# Altium footprint library AD_Connectors.PcbLib: 131 footprints (part 5 of 9)
Each footprint in its own frame and in the unit in brackets; x right, y up, seen from the top. Pads: shape width x height; smd on the part's side, far side on the other; paste and mask are expansions set on the pad; w line width, h text height; cw(c..) or ccw(c..) is an arc to the next point about the centre after c.
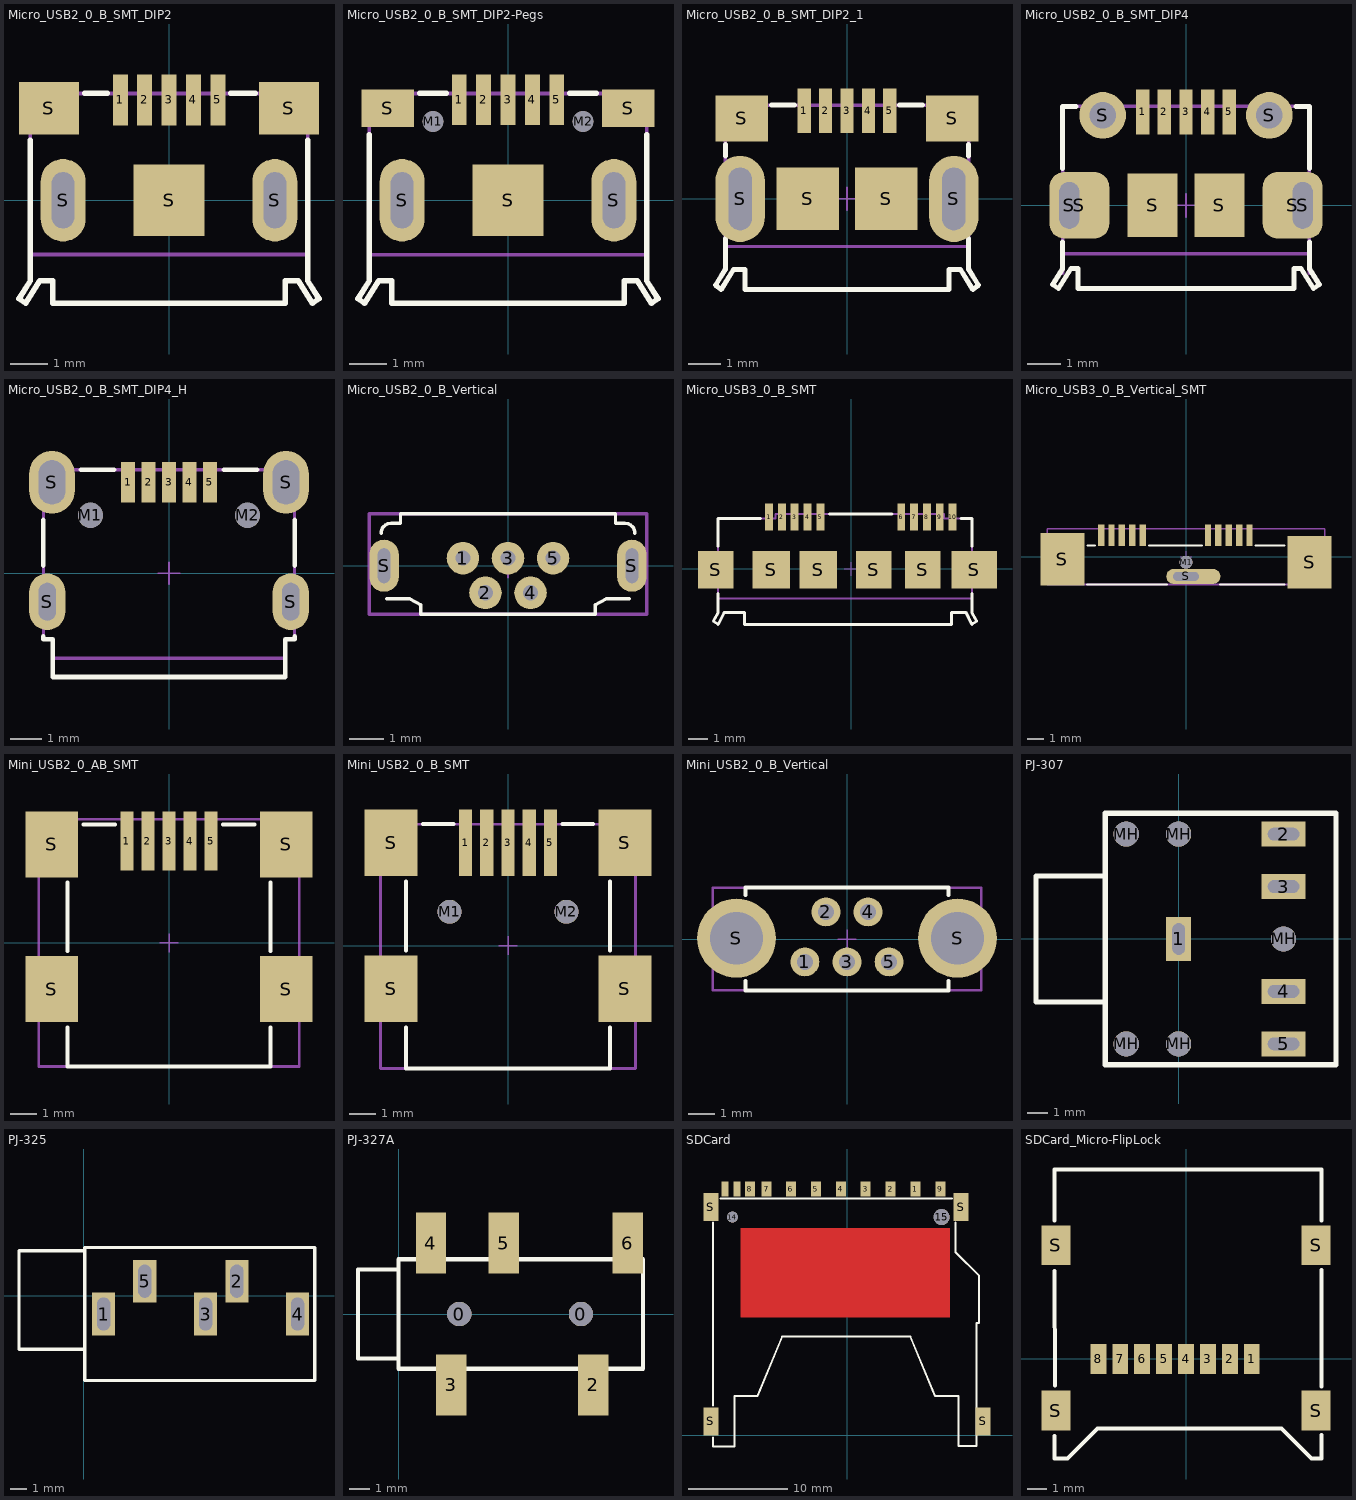
[diagram p4: the footprints below, top view; thin cyan lines are the x and y axes]

## Micro_USB2_0_B_SMT_DIP2 [mm] "Micro USB 2.0 Type B Horizontal SMT 2DIP with Pegs"
height 3
pads (10):
  rect 0.4x1.35 smd: 1(-1.3,2.675) 2(-0.65,2.675) 3(0,2.675) 4(0.65,2.675) 5(1.3,2.675)
  rect 1.6x1.4 smd: S(-3.2,2.45) S(3.2,2.45)
  rrect100% 1.2x2.2 hole 1.5 slot 0.6 at 0 deg: S(-2.825,0) S(2.825,0)
  rect 1.9x1.9 smd: S(0,0)
Top Overlay:
  lines w0.15: -3.7,1.6 -3.7,-2.15 -4,-2.625 -3.825,-2.75 -3.45,-2.15 -3.1,-2.15 -3.1,-2.75 3.1,-2.75 3.1,-2.15 3.45,-2.15 3.825,-2.75 4,-2.625 3.7,-2.15 3.7,1.6 ; -2.25,2.85 -1.65,2.85 ; 1.65,2.85 2.3,2.85
Mechanical 1:
  lines w0.1: -3.7,-1.45 3.7,-1.45
  text "PCB Edge" at -1.4,-2.1 h0.76
Mechanical 13:
  lines w0.1: -4,-2.625 -3.825,-2.75 -3.45,-2.15 -3.1,-2.15 -3.1,-2.75 3.1,-2.75 3.1,-2.15 3.45,-2.15 3.825,-2.75 4,-2.625 3.7,-2.15 3.7,2.85 -3.7,2.85 -3.7,-2.15 -4,-2.625
Mechanical 15:
  lines w0.05: -0.35,0 0.35,0 ; 0,-0.35 0,0.35
3D body "User Library-usb_port_ch.STEP": height 2.82, standoff -0.75, extent -4,-2.75 4,2.85

## Micro_USB2_0_B_SMT_DIP2-Pegs [mm] "Micro USB 2.0 Type B Horizontal SMT 2DIP with Pegs"
height 3
pads (12):
  rect 0.4x1.35 smd: 1(-1.3,2.675) 2(-0.65,2.675) 3(0,2.675) 4(0.65,2.675) 5(1.3,2.675)
  round 0.55 hole 0.55 unplated: M1(-2,2.1) M2(2,2.1)
  rect 1.4x1 smd: S(-3.2,2.45) S(3.2,2.45)
  rrect100% 1.2x2.2 hole 1.5 slot 0.6 at 0 deg: S(-2.825,0) S(2.825,0)
  rect 1.9x1.9 smd: S(0,0)
Top Overlay:
  lines w0.15: -3.7,1.75 -3.7,-2.15 -4,-2.625 -3.825,-2.75 -3.45,-2.15 -3.1,-2.15 -3.1,-2.75 3.1,-2.75 3.1,-2.15 3.45,-2.15 3.825,-2.75 4,-2.625 3.7,-2.15 3.7,1.75 ; -2.35,2.85 -1.65,2.85 ; 1.65,2.85 2.35,2.85
Mechanical 1:
  lines w0.1: -3.7,-1.45 3.7,-1.45
  text "PCB Edge" at -1.4,-2.1 h0.76
Mechanical 13:
  lines w0.1: -4,-2.625 -3.7,-2.15 -3.7,2.85 3.7,2.85 3.7,-2.15 4,-2.625 3.825,-2.75 3.45,-2.15 3.1,-2.15 3.1,-2.75 -3.1,-2.75 -3.1,-2.15 -3.45,-2.15 -3.825,-2.75 -4,-2.625
Mechanical 15:
  lines w0.05: -0.35,0 0.35,0 ; 0,-0.35 0,0.35
3D body "User Library-usb_port_ch.STEP": height 2.82, standoff -0.75, extent -4,-2.75 4,2.85

## Micro_USB2_0_B_SMT_DIP2_1 [mm] "Micro USB 2.0 Type B Horizontal SMT 2DIP"
height 3
pads (11):
  rect 0.4x1.35 smd: 1(-1.3,2.675) 2(-0.65,2.675) 3(0,2.675) 4(0.65,2.675) 5(1.3,2.675)
  rrect100% 1.5x2.62 hole 1.9 slot 0.7 at 0 deg: S(-3.25,0) S(3.25,0)
  rect 1.6x1.4 smd: S(-3.2,2.45) S(3.2,2.45)
  rect 1.9x1.9 smd: S(-1.2,0) S(1.2,0)
Top Overlay:
  lines w0.15: -3.7,-1.2 -3.7,-2.15 -4,-2.625 -3.825,-2.75 -3.45,-2.15 -3.1,-2.15 -3.1,-2.75 3.1,-2.75 3.1,-2.15 3.45,-2.15 3.825,-2.75 4,-2.625 3.7,-2.15 3.7,-1.2 ; -3.7,1.3 -3.7,1.65 ; -2.3,2.85 -1.6,2.85 ; 1.6,2.85 2.3,2.85 ; 3.7,1.3 3.7,1.65
Mechanical 1:
  lines w0.1: -3.7,-1.45 3.7,-1.45
  text "PCB Edge" at -1.4,-2.1 h0.76
Mechanical 13:
  lines w0.1: -4,-2.625 -3.7,-2.15 -3.7,2.85 3.7,2.85 3.7,-2.15 4,-2.625 3.825,-2.75 3.45,-2.15 3.1,-2.15 3.1,-2.75 -3.1,-2.75 -3.1,-2.15 -3.45,-2.15 -3.825,-2.75 -4,-2.625
Mechanical 15:
  lines w0.05: -0.35,0 0.35,0 ; 0,-0.35 0,0.35
3D body "msbr-18.stp": height 2.85, standoff -0.7, extent -4.049,-2.702 4.049,2.929

## Micro_USB2_0_B_SMT_DIP4 [mm] "Micro USB 2.0 Type B Horizontal SMT 4DIP"
height 3
pads (13):
  rect 0.4x1.35 smd: 1(-1.3,2.805) 2(-0.65,2.805) 3(0,2.805) 4(0.65,2.805) 5(1.3,2.805)
  rrect100% 1.2x2 hole 1.4 slot 0.6 at 0 deg: S(-3.5,0) S(3.5,0)
  rrect50% 1.8x2 smd: S(-3.2,0) S(3.2,0)
  round 1.4 hole 0.8: S(-2.5,2.7) S(2.5,2.7)
  rect 1.5x1.9 smd: S(-1,0) S(1,0)
Top Overlay:
  lines w0.15: -3.7,-1.1 -3.7,-1.9 -4,-2.375 -3.825,-2.5 -3.45,-1.9 -3.24,-1.9 -3.24,-2.5 3.24,-2.5 3.24,-1.9 3.45,-1.9 3.825,-2.5 4,-2.375 3.7,-1.9 3.7,-1.1 ; -3.7,1.1 -3.7,2.97 -3.3,2.97 ; 3.3,2.97 3.7,2.97 3.7,1.1
Mechanical 1:
  lines w0.1: -3.7,-1.45 3.7,-1.45
  text "PCB Edge" at -1.5,-2.1 h0.76
Mechanical 13:
  lines w0.1: -3.7,-2.04 -3.7,2.97 3.7,2.97 3.7,-2.04 ; -3.7,-1.9 -4,-2.375 -3.825,-2.5 -3.45,-1.9 -3.24,-1.9 -3.24,-2.5 3.24,-2.5 3.24,-1.9 3.45,-1.9 3.825,-2.5 4,-2.375 3.7,-1.9
Mechanical 15:
  lines w0.05: -0.35,0 0.35,0 ; 0,-0.35 0,0.35
3D body "Micro USB 2.0 Type B Horizontal SMT 4DIP.step": height 2.7, standoff -0.6, extent -4.1,-2.53 4.1,2.9

## Micro_USB2_0_B_SMT_DIP4_H [mm] "Micro USB 2.0 SMT Type B Horizontal 5 Contacts High Current"
height 2.66
pads (11):
  rect 0.45x1.3 smd: 1(-1.3,2.9) 2(-0.65,2.9) 3(0,2.9) 4(0.65,2.9) 5(1.3,2.9)
  round 0.8 hole 0.8 unplated: M1(-2.5,1.85) M2(2.5,1.85)
  oval 1.15x1.8 hole 0.55 slot 1.2 at 90 deg: S(-3.875,-0.9) S(3.875,-0.9)
  oval 1.45x2 hole 0.85 slot 1.4 at 90 deg: S(-3.725,2.9) S(3.725,2.9)
Top Overlay:
  lines w0.15: -4,-2 -4,-2.1 -3.7,-2.1 -3.7,-3.3 3.7,-3.3 3.7,-2.1 4,-2.1 4,-2 ; -4,0.25 -4,1.7 ; -2.8,3.3 -1.75,3.3 ; 1.75,3.3 2.8,3.3 ; 4,0.25 4,1.7
Mechanical 1:
  lines w0.1: -3.7,-2.7 3.7,-2.7
  text "PCB Edge" at -1.4,-2.5 h0.76
  text "PCB Thickness 1.2mm" at -3.4,-4 h0.76
Mechanical 13:
  lines w0.1: -4,-2.1 -4,3.3 4,3.3 4,-2.1 3.7,-2.1 3.7,-3.3 -3.7,-3.3 -3.7,-2.1 -4,-2.1
Mechanical 15:
  lines w0.05: -0.35,0 0.35,0 ; 0,-0.35 0,0.35
3D body "629105150521.stp": height 2.77, standoff -1.75, extent -4,-3.3 4,3.303

## Micro_USB2_0_B_Vertical [mm] "Micro USB 2.0 Type B Vertical 5 Contacts"
height 5.61
pads (7):
  round 0.94 hole 0.44: 1(-1.3,0.22) 2(-0.65,-0.78) 3(0,0.22) 4(0.65,-0.78) 5(1.3,0.22)
  oval 0.85x1.5 hole 0.35 slot 1 at 90 deg: S(-3.575,0) S(3.575,0)
Top Overlay:
  lines w0.1: -3.66,0.94 cw(c-3.38,0.94) -3.373,1.22 -3.1,1.22 -3.1,1.5 3.1,1.5 3.1,1.22 3.373,1.22 cw(c3.38,0.94) 3.66,0.94 ; -3.5,-0.953 -2.828,-0.953 -2.51,-1.13 -2.51,-1.4 2.51,-1.4 2.51,-1.13 2.828,-0.953 3.5,-0.953
Mechanical 1:
  text "PCB Thickness 1.0mm" at -3.5,-2.1 h0.76
Mechanical 13:
  lines w0.1: -4,-1.4 -4,1.5 4,1.5 4,-1.4 -4,-1.4
Mechanical 15:
  lines w0.05: -0.35,0 0.35,0 ; 0,-0.35 0,0.35
3D body "614105150721.stp": height 5.61, standoff -1.84, extent -4,-1.4 4,1.5

## Micro_USB3_0_B_SMT [mm] "Micro USB 3.0 Type B Horizontal SMT"
height 2.58
pads (16):
  rect 0.4x1.35 smd: 1(-4.17,2.63) 2(-3.52,2.63) 3(-2.87,2.63) 4(-2.22,2.63) 5(-1.57,2.63) 6(2.53,2.63) 7(3.18,2.63) 8(3.83,2.63) 9(4.48,2.63) 10(5.13,2.63)
  rect 1.8x1.9 smd: S(-6.87,-0.045) S(1.13,-0.045) S(3.63,-0.045)
  rect 1.9x1.9 smd: S(-4.07,-0.045) S(-1.67,-0.045)
  rect 2.3x1.9 smd: S(6.23,-0.045)
Top Overlay:
  lines w0.15: -6.745,-1.25 -6.745,-2.205 -6.995,-2.645 -6.745,-2.805 -6.445,-2.205 -5.405,-2.205 -5.405,-2.805 5.065,-2.805 5.065,-2.205 5.805,-2.205 6.105,-2.805 6.355,-2.645 6.105,-2.205 6.105,-1.25 ; -6.745,1.15 -6.745,2.545 -4.6,2.545 ; -1.1,2.795 2.05,2.795 ; 5.55,2.545 6.105,2.545 6.105,1.15
Mechanical 1:
  lines w0.1: -6.745,-1.495 6.105,-1.495
  text "PCB Edge" at -1.82,-2.308 h0.89
Mechanical 13:
  lines w0.1: -6.995,-2.645 -6.745,-2.805 -6.445,-2.205 -5.405,-2.205 -5.405,-2.805 5.065,-2.805 5.065,-2.205 5.805,-2.205 6.105,-2.805 6.355,-2.645 6.105,-2.205 6.105,2.545 4.7,2.545 4.7,2.795 -3.85,2.795 -3.85,2.545 -6.745,2.545 -6.745,-2.205 -6.995,-2.645
Mechanical 15:
  lines w0.05: -0.35,0 0.35,0 ; 0,-0.35 0,0.35
3D body "692622030100.stp": height 2.84, standoff -0.11, extent -6.87,-2.795 6.872,2.807

## Micro_USB3_0_B_Vertical_SMT [mm] "Micro USB 3.0 Type B Vertical SMT"
height 5.15
pads (14):
  rect 0.4x1.35 smd: 1(3.98,1.34) 2(3.33,1.34) 3(2.68,1.34) 4(2.03,1.34) 5(1.38,1.34) 6(-2.72,1.34) 7(-3.37,1.34) 8(-4.02,1.34) 9(-4.67,1.34) 10(-5.32,1.34)
  round 0.8 hole 0.8 unplated: M1(0,-0.35)
  rect 2.75x3.3 smd: S(-7.75,-0.16) S(7.75,-0.35)
  oval 3.4x0.95 hole 0.55 slot 1.6 at 0 deg copper offset 0.46,0: S(0,-1.24)
Top Overlay:
  lines w0.15: -6.18,-1.75 -1.21,-1.75 ; -6.17,0.7 -5.72,0.7 ; -2.32,0.7 0.98,0.7 ; 2.13,-1.75 6.17,-1.75 ; 4.37,0.7 6.17,0.7
Mechanical 13:
  lines w0.1: -8.7,-1.75 8.7,-1.75 8.7,1.75 -8.7,1.75 -8.7,-1.75
Mechanical 15:
  lines w0.05: -0.35,0 0.35,0 ; 0,-0.35 0,0.35
3D body "692622420101.stp": height 5.82, standoff -0.83, extent -8.7,-1.75 8.7,1.75

## Mini_USB2_0_AB_SMT [mm] "Mini USB 2.0 Type AB SMT Horizontal 5 Contacts"
height 4
pads (9):
  rect 0.5x2.25 smd: 1(-1.6,3.865) 2(-0.8,3.865) 3(0,3.865) 4(0.8,3.865) 5(1.6,3.865)
  rect 2x2.5 smd: S(-4.45,-1.76) S(-4.45,3.74) S(4.45,-1.76) S(4.45,3.74)
Top Overlay:
  lines w0.15: -3.85,-3.21 -3.85,-4.7 3.85,-4.7 3.85,-3.21 ; -3.85,-0.31 -3.85,2.29 ; -3.25,4.5 -2.05,4.5 ; 2.05,4.5 3.25,4.5 ; 3.85,-0.31 3.85,2.29
Mechanical 13:
  lines w0.1: -4.95,-4.7 4.95,-4.7 4.95,4.7 -4.95,4.7 -4.95,-4.7
Mechanical 15:
  lines w0.05: -0.35,0 0.35,0 ; 0,-0.35 0,0.35
3D body "651305142821.stp": height 4.1, standoff 0, extent -4.95,-4.7 4.95,4.7

## Mini_USB2_0_B_SMT [mm] "Mini USB 2.0 Type B SMT Horizontal 5 Contacts"
height 3.9
pads (11):
  rect 0.5x2.5 smd: 1(-1.6,3.875) 2(-0.8,3.875) 3(0,3.875) 4(0.8,3.875) 5(1.6,3.875)
  round 0.9 hole 0.9 unplated: M1(-2.2,1.275) M2(2.2,1.275)
  rect 2x2.5 smd: S(-4.4,-1.625) S(-4.4,3.875) S(4.4,-1.625) S(4.4,3.875)
Top Overlay:
  lines w0.15: -3.85,-3.075 -3.85,-4.625 3.85,-4.625 3.85,-3.075 ; -3.85,-0.175 -3.85,2.425 ; -3.2,4.575 -2.05,4.575 ; 2.05,4.575 3.2,4.575 ; 3.85,-0.175 3.85,2.425
Mechanical 13:
  lines w0.1: -4.8,-4.625 4.8,-4.625 4.8,4.575 -4.8,4.575 -4.8,-4.625
Mechanical 15:
  lines w0.05: -0.35,0 0.35,0 ; 0,-0.35 0,0.35
3D body "65100516121.stp": height 3.92, standoff -0.98, extent -4.8,-4.625 4.8,4.625

## Mini_USB2_0_B_Vertical [mm] "Mini USB 2.0 Type B Vertical 5 Contacts"
height 9.2
pads (7):
  round 1.1 hole 0.6: 1(-1.6,-0.87) 2(-0.8,1.03) 3(0,-0.87) 4(0.8,1.03) 5(1.6,-0.87)
  round 3 hole 2: S(-4.2,0.03) S(4.2,0.03)
Top Overlay:
  lines w0.15: -3.85,-1.6 -3.85,-1.95 3.85,-1.95 3.85,-1.6 ; -3.85,1.67 -3.85,1.95 3.85,1.95 3.85,1.67
Mechanical 13:
  lines w0.1: -5.1,-1.95 -5.1,1.95 5.1,1.95 5.1,-1.95 -5.1,-1.95
Mechanical 15:
  lines w0.05: -0.35,0 0.35,0 ; 0,-0.35 0,0.35
3D body "651005136421.stp": height 9.45, standoff -2.55, extent -5.099,-1.92 5.098,1.98

## PJ-307 [mm]
pads (10):
  rect 1.2x2.1 hole 1.5 slot 0.6 at 0 deg: 1(0,0)
  rect 2.1x1.2 hole 1.5 slot 0.6 at 90 deg: 2(5,5) 3(5,2.5) 4(5,-2.5) 5(5,-5)
  round 1.2 hole 1.2: MH(-2.5,-5) MH(-2.5,5) MH(0,-5) MH(0,5) MH(5,0)
Top Overlay:
  lines w0.254: -3.5,-3 -6.8,-3 -6.8,3 -3.5,3 ; -3.5,-6 7.5,-6 7.5,6 -3.5,6 -3.5,-6

## PJ-325 [mm] "Connector; Stereo Jack, 3.5mm, 5 Position"
pads (5):
  rect 1.4x2.6 hole 0.8 slot 2 at 90 deg: 1(1.2,-1.1) 2(9.3,0.9) 3(7.4,-1.1) 4(13,-1.1) 5(3.7,0.9)
Top Overlay:
  lines w0.2: 0.05,-3.25 -3.95,-3.25 -3.95,2.75 0.05,2.75 ; 0.05,-5.15 0.05,2.95 14.05,2.95 14.05,-5.15 0.05,-5.15
3D body "User Library-Switchcraft-35RAPC4BV4.step": height 11.5, standoff -2.62, extent -3.985,-5.2 13.985,2.9

## PJ-327A [mm] "Connector; Stereo Jack with Mic, 3.5mm, 5 Position"
pads (7):
  round 1.2 hole 1.2: 0(3,0) 0(9,0)
  rect 1.5x3 smd: 2(9.6,-3.5) 3(2.6,-3.5) 4(1.6,3.5) 5(5.2,3.5) 6(11.3,3.5)
Top Overlay:
  lines w0.2: 0,-2.2 -2,-2.2 -2,2.2 0,2.2 ; 0,-2.7 12.05,-2.7 12.05,2.7 0,2.7 0,-2.7
Mechanical 1:
  lines w0.1: 0,-2.7 0,2.7
  text "PCB Edge" at -0.7,1.5 h0.76

## SDCard [mm]
pads (17):
  rect 1x1.5 smd: 1(6.858,24.709) 2(4.369,24.709) 3(1.875,24.7) 4(-0.625,24.7) 5(-3.125,24.7) 6(-5.625,24.7) 7(-8.055,24.7) 8(-9.75,24.709) 9(9.375,24.7)
  rect 0.7x1.5 smd: 10(-11.05,24.7) 11(-12.25,24.709)
  round 1.1 hole 1.1: 14(-11.5,21.9)
  round 1.6 hole 1.6: 15(9.5,21.9)
  rect 1.5x2.8 smd: S(-13.65,1.4) S(-13.65,22.9) S(11.45,22.9) S(13.65,1.4)
Top Layer:
  pour cut-out: -10.67,20.8 -10.67,11.85 10.3,11.85 10.3,20.8
Top Overlay:
  lines w0.2: -13.462,-0.2 -13.462,-1.1 -11.303,-1.1 -11.303,3.94 -8.989,3.94 -6.5,9.934 6.35,9.934 8.839,3.94 11.2,3.94 11.2,-1.066 13,-1.066 13,11.3 13.25,11.3 13.25,16 10.9,18.35 10.9,21.35 ; -13.462,3 -13.45,21.35 ; -12.7,23.749 10.55,23.75
3D body "c-2041021-3-b-3d.stp": height 3.3, standoff -0.85, extent -14.15,-1.104 13.896,25.146

## SDCard_Micro-FlipLock [mm]
height 2
pads (12):
  rect 0.8x1.5 smd: 1(3.3,0) 2(2.2,0) 3(1.1,0) 4(0,0) 5(-1.1,0) 6(-2.2,0) 7(-3.3,0) 8(-4.4,0)
  rect 1.45x2 smd: S(-6.53,-2.6) S(-6.53,5.7) S(6.53,-2.6) S(6.53,5.7)
Top Overlay:
  lines w0.2: -6.604,4.42 -6.579,-1.346 ; -6.6,-3.882 -6.6,-5 -5.95,-5 -4.45,-3.5 4.8,-3.5 6.3,-5 6.8,-5 6.8,-3.817 ; -6.6,6.938 -6.6,9.5 6.8,9.5 6.8,6.941 ; 6.807,-1.397 6.807,4.47
3D body "User Library-5009010801.STEP": height 1.93, standoff -0.02, extent -7.2,-5 7.4,9.5